# Altium footprint library TarabusLib_KOR.PcbLib: 560 footprints (part 31 of 35)
Each footprint in its own frame and in the unit in brackets; x right, y up, seen from the top. Pads: shape width x height; smd on the part's side, far side on the other; paste and mask are expansions set on the pad; w line width, h text height; cw(c..) or ccw(c..) is an arc to the next point about the centre after c.
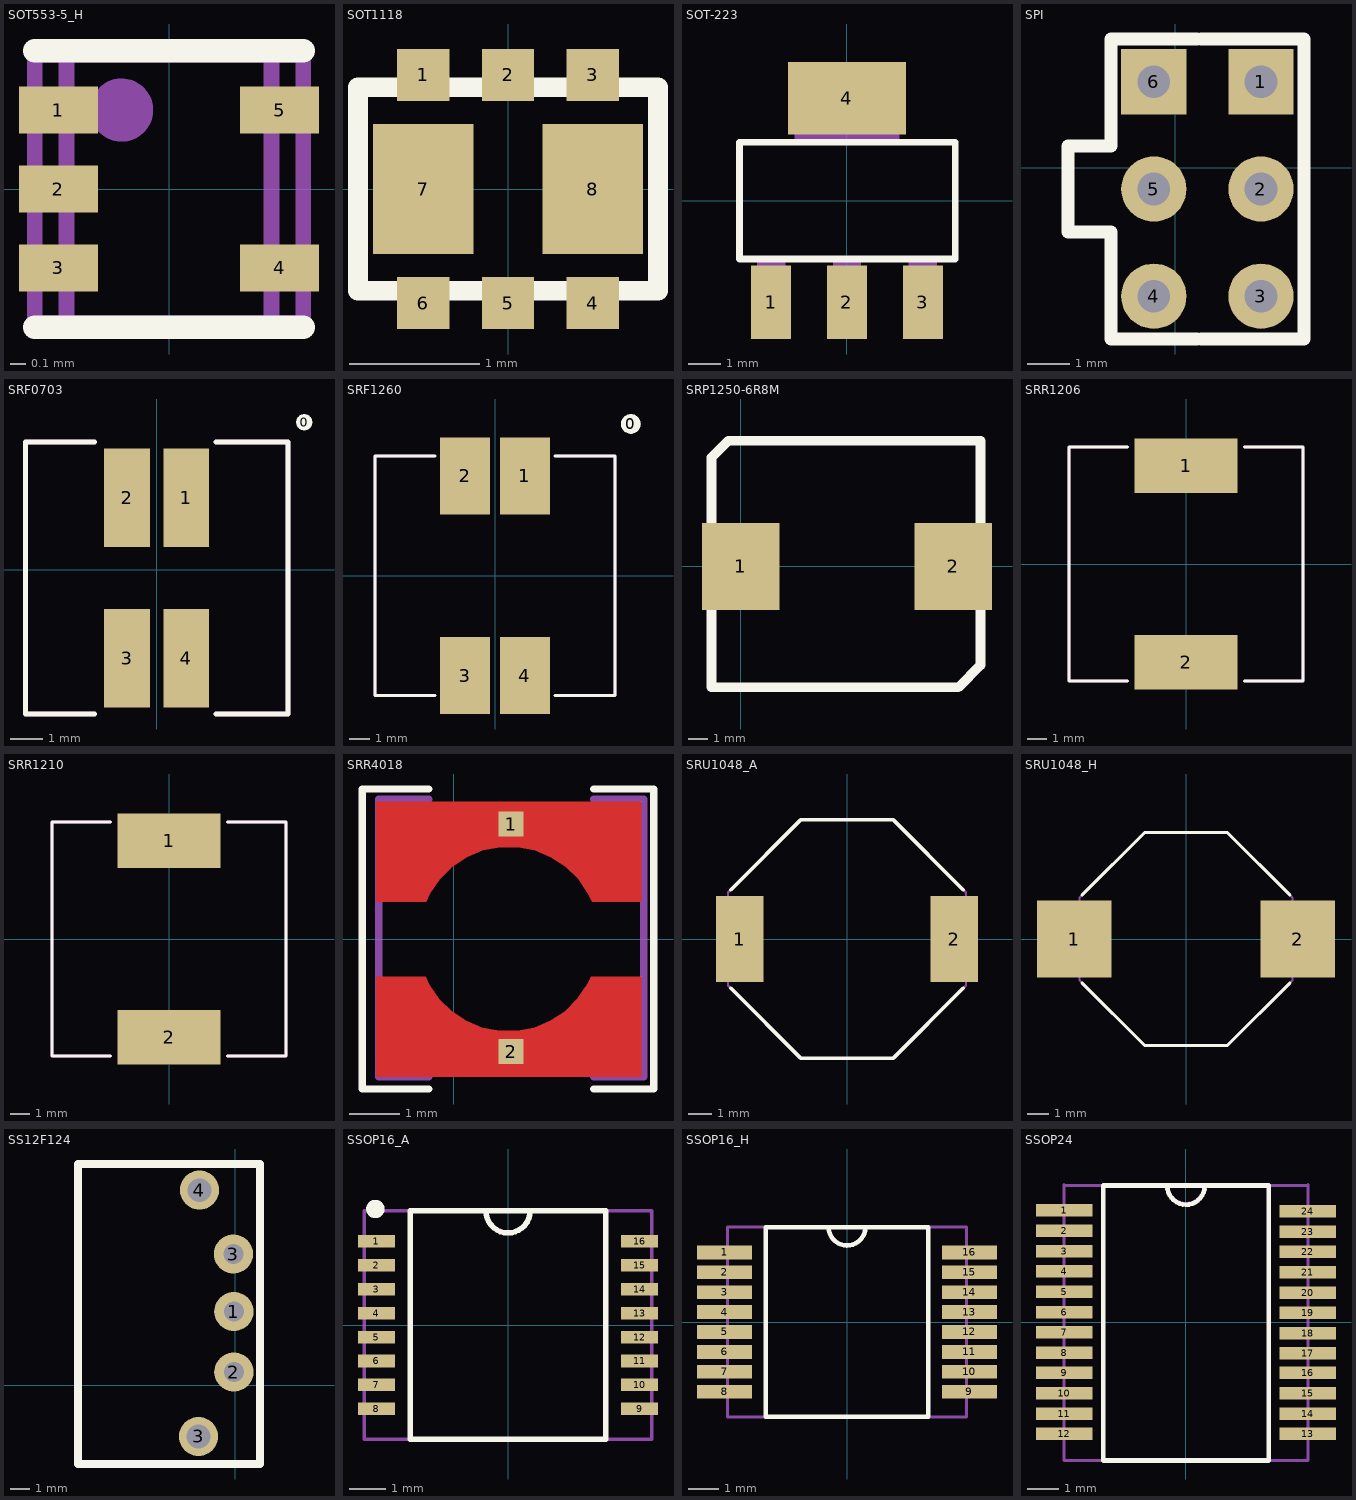
[diagram p30: the footprints below, top view; thin cyan lines are the x and y axes]

## SOT553-5_H [mm]
height 0.6
pads (5):
  rect 0.5x0.3 smd: 1(-0.7,0.5) 2(-0.7,0) 3(-0.7,-0.5) 4(0.7,-0.5) 5(0.7,0.5)
Top Overlay:
  lines w0.15: -0.85,-0.875 0.85,-0.875 ; -0.85,0.875 0.85,0.875
Mechanical 7:
  circle w0.2: c-0.3,0.5 r0.1
  lines w0.1: -0.65,-0.85 -0.65,0.85 ; 0.65,-0.85 0.65,0.85 ; -0.85,-0.85 -0.85,0.85 0.85,0.85 0.85,-0.85 -0.85,-0.85
Mechanical 10:
  text ".Designator" at -0.725,1.175 h0.8
  text ".Comment" at -0.825,-1.45 h0.6
3D body: height 0.6, standoff 0, extent -0.65,-0.85 0.65,0.85
3D body: height 0.2, standoff 0, extent 0.65,-0.85 0.85,0.85
3D body: height 0.2, standoff 0, extent -0.85,-0.85 -0.65,0.85

## SOT1118 [mm]
pads (8):
  rect 0.4x0.4 smd mask+0: 1(-0.65,0.875) 2(0,0.875) 3(0.65,0.875) 4(0.65,-0.875) 5(0,-0.875) 6(-0.65,-0.875)
  rect 0.77x1 smd mask+0: 7(-0.65,0) 8(0.65,0)
Top Overlay:
  lines w0.15: -1.15,-0.78 1.15,-0.78 1.15,0.78 -1.15,0.78 -1.15,-0.78
3D body: height 0.6, standoff 0, extent -1.15,-0.78 1.13,0.8

## SOT-223 [mil]
pads (4):
  rect 48x88 smd: 1(-90.98,-122.01) 2(0,-122.01) 3(91,-122.01)
  rect 142x87 smd: 4(0,123)
Top Overlay:
  lines w8: -129.02,-70 -129.02,70 130,70 130,-70 -129.02,-70
Mechanical 16:
  rectangle: 74,-144 108,-71
  rectangle: -108,-144 -74,-71
  rectangle: -17,-144 17,-71
  rectangle: -63,71 63,144
  rectangle: 74,-144 108,-71
  rectangle: -108,-144 -74,-71
  rectangle: -17,-144 17,-71
  rectangle: -63,71 63,144

## SPI [mil]
height 78.74
pads (6):
  rect 60x60 hole 30: 1(78.74,78.74) 6(-19.69,78.74)
  round 60 hole 30: 2(78.74,-19.68) 3(78.74,-118.11) 4(-19.69,-118.11) 5(-19.69,-19.68)
Top Overlay:
  lines w11.81: 19.68,-157.48 -59.06,-157.48 -59.06,-59.06 ; 19.68,118.11 -59.06,118.11 -59.06,19.69 ; 23.62,-157.48 118.11,-157.48 118.11,118.11 ; 23.62,118.11 118.11,118.11 ; -59.06,-59.06 -98.43,-59.06 -98.43,19.68 -59.06,19.68 ; -59.06,-59.06 -59.06,-59.06 ; -59.06,19.68 -59.06,19.69 ; 118.11,118.11 118.11,118.11
3D body "3х пин.STEP": height 330.95, standoff -121.81, extent -68.5,-170.27 31.5,130.91
3D body "3х пин.STEP": height 330.95, standoff -121.81, extent 29.92,-170.27 129.92,130.91

## SRF0703 [mm]
pads (5):
  round 0.5 on Top Overlay: 0(4.5,4.5)
  rect 1.4x3 smd: 1(0.9,2.2) 2(-0.9,2.2) 3(-0.9,-2.7) 4(0.9,-2.7)
Top Overlay:
  lines w0.15: -1.9,-4.4 -4,-4.4 -4,3.9 -1.9,3.9 ; 1.8,-4.4 4,-4.4 4,3.9 1.8,3.9
Mechanical 9:
  text ".Comment" at 0,4.7 h0.8
  text ".Designator" at 0.5,-5.4 h0.8
Mechanical 11:
  lines w0.15: -1.9,-4.4 -4,-4.4 -4,3.9 -1.9,3.9 ; 1.8,-4.4 4,-4.4 4,3.9 1.8,3.9
3D body "SRF0703.STEP": height 3.4, standoff -0.05, extent -3.8,-4.075 3.8,3.525

## SRF1260 [mm]
pads (5):
  round 1 on Top Overlay: 0(6.8,7.6)
  rect 2.5x3.85 smd: 1(1.5,5) 2(-1.5,5) 3(-1.5,-5) 4(1.5,-5)
Top Overlay:
  lines w0.15: -3,-6 -6,-6 -6,6 -3,6 ; 3,-6 6,-6 6,6 3,6
Mechanical 9:
  text ".Designator" at 7,-6 h0.8
  text ".Comment" at 7,5 h0.8
Mechanical 11:
  lines w0.15: -3,-6 -6,-6 -6,6 -3,6 ; 3,-6 6,-6 6,6 3,6
3D body "SRF1260A.STEP": height 5.67, standoff 0.06, extent -6.057,-6.171 5.943,6.045

## SRP1250-6R8M [mm] "Bourns Inductor 6.8 uH"
height 6
pads (2):
  rect 4x4.5 smd: 1(0,0) 2(11,0)
Top Overlay:
  lines w0.5: -1.5,-6.25 -1.5,0 -1.5,5.625 -0.625,6.5 12.4,6.5 12.4,-5.1 11.25,-6.25 -1.5,-6.25
3D body: height 6, standoff 0.2, extent -1.5,-6.25 12.375,6.5

## SRR1206 [mm]
pads (2):
  rect 5.3x2.8 smd: 1(0,5.05) 2(0,-5.05)
Top Overlay:
  lines w0.15: -3,-6 -6,-6 -6,6 -3,6 ; 3,-6 6,-6 6,6 3,6
Mechanical 7:
  lines w0.15: -3,-6 -6,-6 -6,6 -3,6 ; 3,-6 6,-6 6,6 3,6
3D body "SRR1206-330YL.STEP": height 6.5, standoff -0.02, extent -6.2,-6.45 6.5,6.45

## SRR1210 [mm]
pads (2):
  rect 5.3x2.8 smd: 1(0,5.05) 2(0,-5.05)
Top Overlay:
  lines w0.15: -3,-6 -6,-6 -6,6 -3,6 ; 3,-6 6,-6 6,6 3,6
Mechanical 7:
  lines w0.15: -3,-6 -6,-6 -6,6 -3,6 ; 3,-6 6,-6 6,6 3,6
3D body "srr1210.STEP": height 10, standoff 0, extent -5.875,-6.375 6.125,5.625

## SRR4018 [mm]
pads (2):
  rect 0.5x0.5 smd: 1(1.15,2.3) 2(1.15,-2.25)
Top Layer:
  region: -1.55,0.75 -0.55,0.75 -0.474,0.908 -0.277,1.197 -0.029,1.443 0.263,1.637 0.586,1.77 0.929,1.838 1.279,1.839 1.623,1.772 1.946,1.639 2.239,1.447 2.488,1.202 2.685,0.913 2.762,0.755 2.775,0.75 3.75,0.75 3.75,2.75 -1.55,2.75
  region: 3.75,-0.75 2.75,-0.75 2.674,-0.908 2.477,-1.197 2.229,-1.443 1.937,-1.637 1.614,-1.77 1.271,-1.838 0.921,-1.839 0.577,-1.772 0.254,-1.639 -0.039,-1.447 -0.288,-1.202 -0.485,-0.913 -0.562,-0.755 -0.575,-0.75 -1.55,-0.75 -1.55,-2.75 3.75,-2.75
Top Overlay:
  lines w0.15: -0.5,-3 -1.825,-3 -1.825,3 -0.5,3 ; 2.8,-3 4,-3 4,3 2.8,3
Mechanical 9:
  text ".Designator" at -0.05,-0.5 h0.8
  text ".Comment" at -0.35,0.3 h0.8
Mechanical 11:
  lines w0.15: -0.5,-2.75 -1.5,-2.75 -1.5,2.8 -0.5,2.8 ; 2.8,-2.75 3.8,-2.75 3.8,2.8 2.8,2.8
3D body "SRR4018 Series.STEP": height 1.8, standoff 0, extent -1.325,-2.425 3.475,2.375

## SRU1048_A [mm]
height 5.1
pads (2):
  rect 2x3.6 smd: 1(-4.5,0) 2(4.5,0)
Top Overlay:
  lines w0.15: -4.875,-2.075 -1.95,-5 1.95,-5 4.875,-2.075 ; -4.875,2.075 -1.95,5 1.95,5 4.875,2.075
Mechanical 7:
  lines w0.1: -5,-1.95 -5,1.95 -1.95,5 1.95,5 5,1.95 5,-1.95 1.95,-5 -1.95,-5 -5,-1.95
Mechanical 10:
  text ".Comment" at -1.235,5.625 h0.6
  text ".Designator" at -1.235,6.315 h0.8
3D body: height 5.1, standoff 0, extent -5,-5 5,5

## SRU1048_H [mm]
height 5.1
pads (2):
  rect 3.5x3.6 smd: 1(-5.25,0) 2(5.25,0)
Top Overlay:
  lines w0.15: -4.875,-2.075 -1.95,-5 1.95,-5 4.875,-2.075 ; -4.875,2.075 -1.95,5 1.95,5 4.875,2.075
Mechanical 7:
  lines w0.1: -5,-1.95 -5,1.95 -1.95,5 1.95,5 5,1.95 5,-1.95 1.95,-5 -1.95,-5 -5,-1.95
Mechanical 10:
  text ".Comment" at -1.235,5.625 h0.6
  text ".Designator" at -1.235,6.315 h0.8
3D body: height 5.1, standoff 0, extent -5,-5 5,5

## SS12F124 [mm]
pads (5):
  round 2 hole 1: 1(-0.075,3.75) 2(-0.075,0.675) 3(-0.1,6.675)
  round 2 hole 1.2: 3(-1.875,-2.6) 4(-1.825,9.925)
Top Overlay:
  lines w0.4: -8,-4 1.25,-4 1.25,11.25 -8,11.25 -8,-4
3D body "SS12F124.STEP": height 6, standoff -3, extent -12.575,-2.85 0.175,10.15

## SSOP16_A [mm]
height 1.99
pads (16):
  rect 1x0.34 smd: 1(-3.57,2.275) 2(-3.57,1.625) 3(-3.57,0.975) 4(-3.57,0.325) 5(-3.57,-0.325) 6(-3.57,-0.975) 7(-3.57,-1.625) 8(-3.57,-2.275) 9(3.57,-2.275) 10(3.57,-1.625) 11(3.57,-0.975) 12(3.57,-0.325) 13(3.57,0.325) 14(3.57,0.975) 15(3.57,1.625) 16(3.57,2.275)
Top Overlay:
  circle w0.25: c-3.6,3.15 r0.125
  lines w0.15: -0.6,3.1 ccw(c0,3.1) 0.6,3.09 ; -2.65,-3.1 2.65,-3.1 2.65,3.1 -2.65,3.1 -2.65,-3.1
Mechanical 9:
  text ".Comment" at -1.02,-3.71 h0.6
  text ".Designator" at -1.23,3.46 h0.8
Mechanical 11:
  lines w0.1: -2.65,-3.1 -2.65,3.1 ; -0.6,3.1 ccw(c0,3.1) 0.6,3.09 ; 2.65,-3.1 2.65,3.1 ; -3.9,-3.1 -3.9,3.1 3.9,3.1 3.9,-3.1 -3.9,-3.1
3D body "SSOP-16.STEP": height 1.9, standoff 0, extent -3.875,-3.125 3.925,3.075

## SSOP16_H [mm]
height 1.99
pads (16):
  rect 1.8x0.45 smd: 1(-4,2.275) 2(-4,1.625) 3(-4,0.975) 4(-4,0.325) 5(-4,-0.325) 6(-4,-0.975) 7(-4,-1.625) 8(-4,-2.275) 9(4,-2.275) 10(4,-1.625) 11(4,-0.975) 12(4,-0.325) 13(4,0.325) 14(4,0.975) 15(4,1.625) 16(4,2.275)
Top Overlay:
  lines w0.15: -0.6,3.1 ccw(c0,3.1) 0.6,3.09 ; -2.65,-3.1 -2.65,3.1 2.65,3.1 2.65,-3.1 -2.65,-3.1
Mechanical 7:
  lines w0.1: -2.65,-3.1 -2.65,3.1 ; -0.6,3.1 ccw(c0,3.1) 0.6,3.09 ; 2.65,-3.1 2.65,3.1 ; -3.9,-3.1 -3.9,3.1 3.9,3.1 3.9,-3.1 -3.9,-3.1
Mechanical 10:
  text ".Designator" at -1.23,3.46 h0.8
  text ".Comment" at -0.67,-3.72 h0.6
3D body: height 1.99, standoff 0, extent -2.65,-3.1 2.65,3.1
3D body: height 0.75, standoff 0, extent -3.9,-3.1 -2.65,3.1
3D body: height 0.75, standoff 0, extent 2.65,-3.1 3.9,3.1

## SSOP24 [mm]
height 1.85
pads (24):
  rect 1.8x0.4 smd: 1(-3.9,3.575) 2(-3.9,2.925) 3(-3.9,2.275) 4(-3.9,1.625) 5(-3.9,0.975) 6(-3.9,0.325) 7(-3.9,-0.325) 8(-3.9,-0.975) 9(-3.9,-1.625) 10(-3.9,-2.275) 11(-3.9,-2.925) 12(-3.9,-3.575) 13(3.9,-3.575) 14(3.9,-2.925) 15(3.9,-2.275) 16(3.9,-1.625) 17(3.9,-1) 18(3.9,-0.35) 19(3.9,0.3) 20(3.9,0.95) 21(3.9,1.6) 22(3.9,2.25) 23(3.9,2.9) 24(3.9,3.55)
Top Overlay:
  lines w0.15: -0.6,4.36 ccw(c0,4.36) 0.6,4.35 ; -2.65,-4.425 2.65,-4.425 2.65,4.375 -2.65,4.375 -2.65,-4.425
Mechanical 7:
  lines w0.1: -3.9,4.375 3.9,4.375 ; -3.9,4.4 -3.9,-4.425 3.9,-4.425 3.9,4.4 ; -2.65,-1.8 -2.65,4.35 ; -0.6,4.4 ccw(c0,4.4) 0.6,4.39 ; 2.65,-1.8 2.65,4.4
Mechanical 10:
  text ".Comment" at -0.95,-5.05 h0.6
  text ".Designator" at -1.5,4.725 h0.8
3D body: height 0.75, standoff 0, extent 2.65,-4.425 3.9,4.4
3D body: height 0.75, standoff 0, extent -3.9,-4.425 -2.65,4.4
3D body: height 1.99, standoff 0, extent -2.65,-4.425 2.65,4.45